# Altium footprint library modules.PcbLib: 6 footprints
Each footprint in its own frame and in the unit in brackets; x right, y up, seen from the top. Pads: shape width x height; smd on the part's side, far side on the other; paste and mask are expansions set on the pad; w line width, h text height; cw(c..) or ccw(c..) is an arc to the next point about the centre after c.
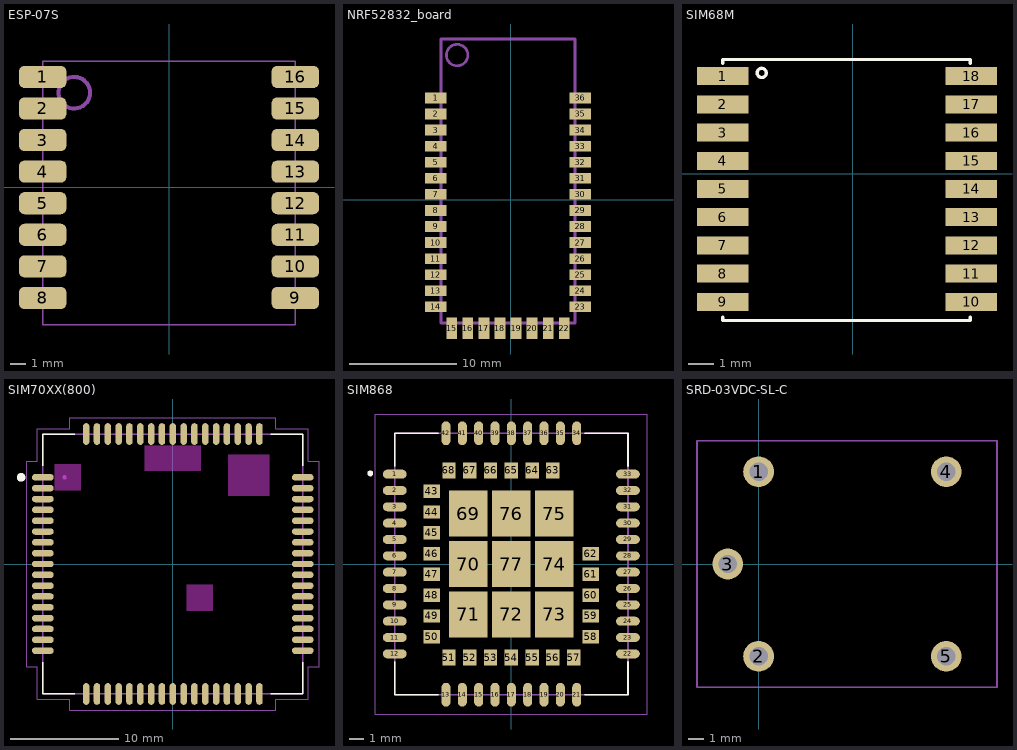
[diagram p0: the footprints below, top view; thin cyan lines are the x and y axes]

## ESP-07S [mm]
pads (16):
  rrect50% 3x1.4 smd: 1(-8,7) 2(-8,5) 3(-8,3) 4(-8,1) 5(-8,-1) 6(-8,-3) 7(-8,-5) 8(-8,-7) 9(8,-7) 10(8,-5) 11(8,-3) 12(8,-1) 13(8,1) 14(8,3) 15(8,5) 16(8,7)
Mechanical 3:
  text ".Designator" at -4,-1 h0.8
Mechanical 13:
  circle w0.254: c-6,6 r1
  lines w0.1: -8,-8.7 8,-8.7 8,8 -8,8 -8,-8.7
3D body "User Library-ESP07-1.step": height 3.5, standoff -0.01, extent -8,-8.7 8,13.3

## NRF52832_board [mm] "NRF52832 Module Core Board Wireless Bluetooth Transceiver Module"
height 1
pads (36):
  rect 2x1 smd: 1(-7,9.5) 2(-7,8) 3(-7,6.5) 4(-7,5) 5(-7,3.5) 6(-7,2) 7(-7,0.5) 8(-7,-1) 9(-7,-2.5) 10(-7,-4) 11(-7,-5.5) 12(-7,-7) 13(-7,-8.5) 14(-7,-10) 23(6.5,-10) 24(6.5,-8.5) 25(6.5,-7) 26(6.5,-5.5) 27(6.5,-4) 28(6.5,-2.5) 29(6.5,-1) 30(6.5,0.5) 31(6.5,2) 32(6.5,3.5) 33(6.5,5) 34(6.5,6.5) 35(6.5,8) 36(6.5,9.5)
  rect 1x2 smd: 15(-5.5,-12) 16(-4,-12) 17(-2.5,-12) 18(-1,-12) 19(0.5,-12) 20(2,-12) 21(3.5,-12) 22(5,-12)
Mechanical 3:
  text ".Designator" at -2.5,-0.5 h1.52
Mechanical 13:
  circle w0.254: c-5,13.5 r1
  lines w0.254: -6.5,-11.5 -6.5,15 6,15 6,9.5 6,-11.5 -6.5,-11.5
3D body: height 1, standoff 0, extent -6.5,-11.5 6,15

## SIM68M [mm] "GPS module"
pads (18):
  rect 2x0.7 smd: 1(-5.08,3.81) 2(-5.08,2.71) 3(-5.08,1.61) 4(-5.08,0.51) 5(-5.08,-0.59) 6(-5.08,-1.69) 7(-5.08,-2.79) 8(-5.08,-3.89) 9(-5.08,-4.99) 10(4.62,-4.99) 11(4.62,-3.89) 12(4.62,-2.79) 13(4.62,-1.69) 14(4.62,-0.59) 15(4.62,0.51) 16(4.62,1.61) 17(4.62,2.71) 18(4.62,3.81)
Top Overlay:
  circle w0.127: c-3.556,3.937 r0.18
  lines w0.127: -5.08,-5.588 -5.08,-5.715 4.572,-5.715 4.572,-5.588 ; -5.08,4.318 -5.08,4.46 4.572,4.46 4.572,4.318
Mechanical 3:
  text ".Designator" at 0,0 h0.8

## SIM70XX(800) [mm] "SIM7000/7070/800 Series modules"
pads (68):
  oval 2x0.6 smd: 1(-12,8) 2(-12,7) 3(-12,6) 4(-12,5) 5(-12,4) 6(-12,3) 7(-12,2) 8(-12,1) 9(-12,0) 10(-12,-1) 11(-12,-2) 12(-12,-3) 13(-12,-4) 14(-12,-5) 15(-12,-6) 16(-12,-7) 17(-12,-8) 35(12,-8) 36(12,-7) 37(12,-6) 38(12,-5) 39(12,-4) 40(12,-3) 41(12,-2) 42(12,-1) 43(12,0) 44(12,1) 45(12,2) 46(12,3) 47(12,4) 48(12,5) 49(12,6) 50(12,7) 51(12,8)
  oval 0.6x2 smd: 18(-8,-12) 19(-7,-12) 20(-6,-12) 21(-5,-12) 22(-4,-12) 23(-3,-12) 24(-2,-12) 25(-1,-12) 26(0,-12) 27(1,-12) 28(2,-12) 29(3,-12) 30(4,-12) 31(5,-12) 32(6,-12) 33(7,-12) 34(8,-12) 52(8,12) 53(7,12) 54(6,12) 55(5,12) 56(4,12) 57(3,12) 58(2,12) 59(1,12) 60(0,12) 61(-1,12) 62(-2,12) 63(-3,12) 64(-4,12) 65(-5,12) 66(-6,12) 67(-7,12) 68(-8,12)
Top Layer keep-out:
  region: 5.1,10.1 5.1,6.3 8.9,6.3 8.9,10.1
  region: -2.6,10.9 -2.6,8.6 2.6,8.6 2.6,10.9
  region: -8.5,6.806 -10.91,6.806 -10.91,9.2 -8.5,9.2
  region: 3.7,-4.305 1.301,-4.305 1.301,-1.9 3.7,-1.9
Top Overlay:
  circle w0.4: c-14,8 r0.2
  lines w0.127: -12,-9.05 -12,-12 -9.05,-12 ; -12,9.05 -12,12 -9.05,12 ; 9.05,-12 12,-12 12,-9.05 ; 9.05,12 12,12 12,9.05
Mechanical 13:
  circle w0.2: c-10,8 r0.1
  lines w0.127: -12,-12 12,-12 12,12 -12,12 -12,-12
Mechanical 15:
  lines w0.05: -13.5,-9.5 -12.5,-9.5 -12.5,-12.5 -9.5,-12.5 -9.5,-13.5 9.5,-13.5 9.5,-12.5 12.5,-12.5 12.5,-9.5 13.5,-9.5 13.5,9.5 12.5,9.5 12.5,12.5 9.5,12.5 9.5,13.5 -9.5,13.5 -9.5,12.5 -12.5,12.5 -12.5,9.5 -13.5,9.5 -13.5,-9.5
3D body "SIM7000G.step": height 2.8, standoff -0.1, extent -12,-12 12,12

## SIM868 [mm]
pads (77):
  oval 1.6x0.6 smd: 1(-7.85,6.05) 2(-7.85,4.95) 3(-7.85,3.85) 4(-7.85,2.75) 5(-7.85,1.65) 6(-7.85,0.55) 7(-7.85,-0.55) 8(-7.85,-1.65) 9(-7.85,-2.75) 10(-7.85,-3.85) 11(-7.85,-4.95) 12(-7.85,-6.05) 22(7.85,-6.05) 23(7.85,-4.95) 24(7.85,-3.85) 25(7.85,-2.75) 26(7.85,-1.65) 27(7.85,-0.55) 28(7.85,0.55) 29(7.85,1.65) 30(7.85,2.75) 31(7.85,3.85) 32(7.85,4.95) 33(7.85,6.05)
  oval 0.6x1.6 smd: 13(-4.4,-8.8) 14(-3.3,-8.8) 15(-2.2,-8.8) 16(-1.1,-8.8) 17(0,-8.8) 18(1.1,-8.8) 19(2.2,-8.8) 20(3.3,-8.8) 21(4.4,-8.8) 34(4.4,8.8) 35(3.3,8.8) 36(2.2,8.8) 37(1.1,8.8) 38(0,8.8) 39(-1.1,8.8) 40(-2.2,8.8) 41(-3.3,8.8) 42(-4.4,8.8)
  rect 1.1x0.9 smd: 43(-5.35,4.9) 44(-5.35,3.5) 45(-5.35,2.1) 46(-5.35,0.7) 47(-5.35,-0.7) 48(-5.35,-2.1) 49(-5.35,-3.5) 50(-5.35,-4.9) 58(5.35,-4.9) 59(5.35,-3.5) 60(5.35,-2.1) 61(5.35,-0.7) 62(5.35,0.7)
  rect 0.9x1.1 smd: 51(-4.2,-6.3) 52(-2.8,-6.3) 53(-1.4,-6.3) 54(0,-6.3) 55(1.4,-6.3) 56(2.8,-6.3) 57(4.2,-6.3) 63(2.8,6.3) 64(1.4,6.3) 65(0,6.3) 66(-1.4,6.3) 67(-2.8,6.3) 68(-4.2,6.3)
  rect 2.6x3.1 smd: 69(-2.9,3.4) 70(-2.9,0) 71(-2.9,-3.4) 72(0,-3.4) 73(2.9,-3.4) 74(2.9,0) 75(2.9,3.4) 76(0,3.4) 77(0,0)
Top Overlay:
  circle w0.2: c-9.5,6.1 r0.1
  lines w0.127: -7.85,-6.6 -7.85,-8.8 -4.95,-8.8 ; -7.85,6.6 -7.85,8.8 -4.95,8.8 ; 4.95,-8.8 7.85,-8.8 7.85,-6.6 ; 4.95,8.8 7.85,8.8 7.85,6.6
Top Paste:
  drawing of 140 lines, arcs and shapes, not listed
Mechanical 13:
  lines w0.127: -7.85,-8.8 -7.85,8.8 ; -7.85,-8.8 7.85,-8.8 ; -7.85,-8.8 -7.85,8.8 ; -7.85,-8.8 7.85,-8.8 ; -7.85,8.8 7.85,8.8 ; -7.85,8.8 7.85,8.8 ; 7.85,-8.8 7.85,8.8 ; 7.85,-8.8 7.85,8.8
Mechanical 15:
  lines w0.05: -9.15,-10.1 -9.15,10.1 9.15,10.1 9.15,-10.1 -9.15,-10.1

## SRD-03VDC-SL-C [mm]
pads (5):
  round 2 hole 1.2: 1(0,6) 2(0,-6) 3(-2,0) 4(12.2,6) 5(12.2,-6)
Mechanical 3:
  text ".Designator" at 4,0 h0.8
Mechanical 13:
  lines w0.1: -4,-8 -4,8 15.5,8 15.5,-8 -4,-8
3D body "User Library-Relay SPDT.step": height 15.4, standoff -4, extent -3.8,-7.7 15.2,7.8